# Altium footprint library ref-packages-longpad.PCBLIB: 1527 footprints (part 35 of 103) (continued)
## MQFP80-2 [mm] (continued)
  rectangle: -11.473,-0.6 -9.873,-0.2
  rectangle: -11.473,-1.4 -9.873,-1
  rectangle: -11.473,-2.2 -9.873,-1.8
  rectangle: -11.473,-3 -9.848,-2.6
  rectangle: -11.473,-3.8 -9.898,-3.4
  rectangle: -11.473,-4.6 -9.873,-4.2
  rectangle: -11.473,-5.4 -9.873,-5
  rectangle: 9.873,5.8 11.473,6.2
  rectangle: 9.873,5 11.473,5.4
  rectangle: 9.873,4.2 11.473,4.6
  rectangle: 9.873,3.4 11.473,3.8
  rectangle: 9.873,2.6 11.473,3
  rectangle: 9.873,1.8 11.473,2.2
  rectangle: 9.873,1 11.473,1.4
  rectangle: 9.848,0.2 11.473,0.6
  rectangle: 9.873,-0.6 11.473,-0.2
  rectangle: 9.873,-1.4 11.473,-1
  rectangle: 9.873,-2.2 11.473,-1.8
  rectangle: 9.873,-3 11.473,-2.6
  rectangle: 9.873,-3.8 11.473,-3.4
  rectangle: 9.873,-4.6 11.473,-4.2
  rectangle: 9.873,-5.4 11.473,-5
  rectangle: 9.873,-6.2 11.473,-5.8
  rectangle: -11.473,-6.2 -9.873,-5.8

## MQFP100 [mm]
pads (100):
  rect 0.35x2.2 smd: 1(-9.425,-8.1) 2(-8.775,-8.1) 3(-8.125,-8.1) 4(-7.475,-8.1) 5(-6.825,-8.1) 6(-6.175,-8.1) 7(-5.525,-8.1) 8(-4.875,-8.1) 9(-4.225,-8.1) 10(-3.575,-8.1) 11(-2.925,-8.1) 12(-2.275,-8.1) 13(-1.625,-8.1) 14(-0.975,-8.1) 15(-0.325,-8.1) 16(0.325,-8.1) 17(0.975,-8.1) 18(1.625,-8.1) 19(2.275,-8.1) 20(2.925,-8.1) 21(3.575,-8.1) 22(4.225,-8.1) 23(4.875,-8.1) 24(5.525,-8.1) 25(6.175,-8.1) 26(6.825,-8.1) 27(7.475,-8.1) 28(8.125,-8.1) 29(8.775,-8.1) 30(9.425,-8.1) 51(9.425,8.1) 52(8.775,8.1) 53(8.125,8.1) 54(7.475,8.1) 55(6.825,8.1) 56(6.175,8.1) 57(5.525,8.1) 58(4.875,8.1) 59(4.225,8.1) 60(3.575,8.1) 61(2.925,8.1) 62(2.275,8.1) 63(1.625,8.1) 64(0.975,8.1) 65(0.325,8.1) 66(-0.325,8.1) 67(-0.975,8.1) 68(-1.625,8.1) 69(-2.275,8.1) 70(-2.925,8.1) 71(-3.575,8.1) 72(-4.225,8.1) 73(-4.875,8.1) 74(-5.525,8.1) 75(-6.175,8.1) 76(-6.825,8.1) 77(-7.475,8.1) 78(-8.125,8.1) 79(-8.775,8.1) 80(-9.425,8.1)
  rect 2.2x0.35 smd: 31(11.1,-6.175) 32(11.1,-5.525) 33(11.1,-4.875) 34(11.1,-4.225) 35(11.1,-3.575) 36(11.1,-2.925) 37(11.1,-2.275) 38(11.1,-1.625) 39(11.1,-0.975) 40(11.1,-0.325) 41(11.1,0.325) 42(11.1,0.975) 43(11.1,1.625) 44(11.1,2.275) 45(11.1,2.925) 46(11.1,3.575) 47(11.1,4.225) 48(11.1,4.875) 49(11.1,5.525) 50(11.1,6.175) 81(-11.1,6.175) 82(-11.1,5.525) 83(-11.1,4.875) 84(-11.1,4.225) 85(-11.1,3.575) 86(-11.1,2.925) 87(-11.1,2.275) 88(-11.1,1.625) 89(-11.1,0.975) 90(-11.1,0.325) 91(-11.1,-0.325) 92(-11.1,-0.975) 93(-11.1,-1.625) 94(-11.1,-2.275) 95(-11.1,-2.925) 96(-11.1,-3.575) 97(-11.1,-4.225) 98(-11.1,-4.875) 99(-11.1,-5.525) 100(-11.1,-6.175)
Top Overlay:
  circle w0.152: c-8.9,-6 r0.608
  lines w0.152: -9.873,-6.473 -9.873,6.473 -9.473,6.873 9.473,6.873 9.873,6.473 9.873,-6.473 9.473,-6.873 -9.473,-6.873 -9.873,-6.473
Mechanical 16:
  rectangle: -9.6,-8.473 -9.25,-6.873
  rectangle: -8.95,-8.473 -8.6,-6.873
  rectangle: -8.3,-8.473 -7.95,-6.873
  rectangle: -7.65,-8.473 -7.3,-6.873
  rectangle: -7,-8.473 -6.65,-6.873
  rectangle: -6.35,-8.473 -6,-6.873
  rectangle: -5.7,-8.473 -5.35,-6.873
  rectangle: -5.05,-8.473 -4.7,-6.873
  rectangle: -4.4,-8.473 -4.05,-6.873
  rectangle: -3.75,-8.473 -3.4,-6.873
  rectangle: -3.1,-8.473 -2.75,-6.873
  rectangle: -2.45,-8.473 -2.1,-6.873
  rectangle: -1.8,-8.473 -1.45,-6.873
  rectangle: -1.15,-8.473 -0.8,-6.873
  rectangle: -0.5,-8.473 -0.15,-6.873
  rectangle: 0.15,-8.473 0.5,-6.873
  rectangle: 0.8,-8.473 1.15,-6.873
  rectangle: 1.45,-8.473 1.8,-6.873
  rectangle: 2.1,-8.473 2.45,-6.873
  rectangle: 2.75,-8.473 3.1,-6.873
  rectangle: 3.4,-8.473 3.75,-6.873
  rectangle: 4.05,-8.473 4.4,-6.873
  rectangle: 4.7,-8.473 5.05,-6.873
  rectangle: 5.35,-8.473 5.7,-6.873
  rectangle: 6,-8.473 6.35,-6.873
  rectangle: 6.65,-8.473 7,-6.873
  rectangle: 7.3,-8.473 7.65,-6.873
  rectangle: 7.95,-8.473 8.3,-6.873
  rectangle: 8.6,-8.473 8.95,-6.873
  rectangle: 9.25,-8.473 9.6,-6.873
  rectangle: -9.6,6.873 -9.25,8.473
  rectangle: -8.95,6.873 -8.6,8.473
  rectangle: -8.3,6.873 -7.95,8.473
  rectangle: -7.65,6.873 -7.3,8.473
  rectangle: -7,6.873 -6.65,8.473
  rectangle: -6.35,6.873 -6,8.473
  rectangle: -5.7,6.873 -5.35,8.473
  rectangle: -5.05,6.873 -4.7,8.473
  rectangle: -4.4,6.873 -4.05,8.473
  rectangle: -3.75,6.873 -3.4,8.473
  rectangle: -3.1,6.873 -2.75,8.473
  rectangle: -2.45,6.873 -2.1,8.473
  rectangle: -1.8,6.873 -1.45,8.473
  rectangle: -1.15,6.873 -0.8,8.473
  rectangle: -0.5,6.873 -0.15,8.473
  rectangle: 0.15,6.873 0.5,8.473
  rectangle: 0.8,6.873 1.15,8.473
  rectangle: 1.45,6.873 1.8,8.473
  rectangle: 2.1,6.873 2.45,8.473
  rectangle: 2.75,6.873 3.1,8.473
  rectangle: 3.4,6.873 3.75,8.473
  rectangle: 4.05,6.873 4.4,8.473
  rectangle: 4.7,6.873 5.05,8.473
  rectangle: 5.35,6.873 5.7,8.473
  rectangle: 6,6.873 6.35,8.473
  rectangle: 6.65,6.873 7,8.473
  rectangle: 7.275,6.873 7.65,8.473
  rectangle: 7.95,6.873 8.3,8.473
  rectangle: 8.6,6.873 8.95,8.473
  rectangle: 9.25,6.873 9.6,8.473
  rectangle: 9.873,6 11.473,6.35
  rectangle: 9.873,5.35 11.473,5.7
  rectangle: 9.873,4.7 11.473,5.05
  rectangle: 9.873,4.05 11.473,4.4
  rectangle: 9.873,3.4 11.473,3.75
  rectangle: 9.873,2.75 11.473,3.1
  rectangle: 9.873,2.1 11.473,2.45
  rectangle: 9.873,1.45 11.473,1.8
  rectangle: 9.873,0.8 11.473,1.15
  rectangle: 9.873,0.15 11.473,0.5
  rectangle: 9.873,-0.5 11.473,-0.15
  rectangle: 9.873,-1.15 11.473,-0.8
  rectangle: 9.873,-1.8 11.473,-1.45
  rectangle: 9.873,-2.45 11.473,-2.1
  rectangle: 9.873,-3.1 11.473,-2.75
  rectangle: 9.873,-3.75 11.473,-3.4
  rectangle: 9.873,-4.4 11.473,-4.05
  rectangle: 9.873,-5.05 11.473,-4.7
  rectangle: 9.873,-5.7 11.473,-5.35
  rectangle: 9.873,-6.35 11.473,-6
  rectangle: -11.473,6 -9.873,6.35
  rectangle: -11.473,5.35 -9.873,5.7
  rectangle: -11.473,4.7 -9.873,5.05
  rectangle: -11.473,4.05 -9.873,4.4
  rectangle: -11.473,3.4 -9.873,3.75
  rectangle: -11.473,2.75 -9.873,3.1
  rectangle: -11.473,2.1 -9.873,2.45
  rectangle: -11.473,1.45 -9.873,1.8
  rectangle: -11.473,0.8 -9.873,1.15
  rectangle: -11.473,0.15 -9.873,0.5
  rectangle: -11.473,-0.5 -9.848,-0.15
  rectangle: -11.473,-1.15 -9.873,-0.8
  rectangle: -11.473,-1.8 -9.873,-1.45
  rectangle: -11.473,-2.45 -9.873,-2.1
  rectangle: -11.473,-3.1 -9.873,-2.75
  rectangle: -11.473,-3.75 -9.873,-3.4
  rectangle: -11.473,-4.4 -9.873,-4.05
  rectangle: -11.473,-5.05 -9.873,-4.7
  rectangle: -11.473,-5.7 -9.873,-5.35
  rectangle: -11.473,-6.35 -9.873,-6

## MQFP132 [mm]
pads (132):
  rect 0.35x2.2 smd: 1(0,12.7) 2(-0.635,12.7) 3(-1.27,12.7) 4(-1.905,12.7) 5(-2.54,12.7) 6(-3.175,12.7) 7(-3.81,12.7) 8(-4.445,12.7) 9(-5.08,12.7) 10(-5.715,12.7) 11(-6.35,12.7) 12(-6.985,12.7) 13(-7.62,12.7) 14(-8.255,12.7) 15(-8.89,12.7) 16(-9.525,12.7) 17(-10.16,12.7) 51(-10.16,-13.97) 52(-9.525,-13.97) 53(-8.89,-13.97) 54(-8.255,-13.97) 55(-7.62,-13.97) 56(-6.985,-13.97) 57(-6.35,-13.97) 58(-5.715,-13.97) 59(-5.08,-13.97) 60(-4.445,-13.97) 61(-3.81,-13.97) 62(-3.175,-13.97) 63(-2.54,-13.97) 64(-1.905,-13.97) 65(-1.27,-13.97) 66(-0.635,-13.97) 67(0,-13.97) 68(0.635,-13.97) 69(1.27,-13.97) 70(1.905,-13.97) 71(2.54,-13.97) 72(3.175,-13.97) 73(3.81,-13.97) 74(4.445,-13.97) 75(5.08,-13.97) 76(5.715,-13.97) 77(6.35,-13.97) 78(6.985,-13.97) 79(7.62,-13.97) 80(8.255,-13.97) 81(8.89,-13.97) 82(9.525,-13.97) 83(10.16,-13.97) 117(10.16,12.7) 118(9.525,12.7) 119(8.89,12.7) 120(8.255,12.7) 121(7.62,12.7) 122(6.985,12.7) 123(6.35,12.7) 124(5.715,12.7) 125(5.08,12.7) 126(4.445,12.7) 127(3.81,12.7) 128(3.175,12.7) 129(2.54,12.7) 130(1.905,12.7) 131(1.27,12.7) 132(0.635,12.7)
  rect 2.2x0.35 smd: 18(-13.335,9.525) 19(-13.335,8.89) 20(-13.335,8.255) 21(-13.335,7.62) 22(-13.335,6.985) 23(-13.335,6.35) 24(-13.335,5.715) 25(-13.335,5.08) 26(-13.335,4.445) 27(-13.335,3.81) 28(-13.335,3.175) 29(-13.335,2.54) 30(-13.335,1.905) 31(-13.335,1.27) 32(-13.335,0.635) 33(-13.335,0) 34(-13.335,-0.635) 35(-13.335,-1.27) 36(-13.335,-1.905) 37(-13.335,-2.54) 38(-13.335,-3.175) 39(-13.335,-3.81) 40(-13.335,-4.445) 41(-13.335,-5.08) 42(-13.335,-5.715) 43(-13.335,-6.35) 44(-13.335,-6.985) 45(-13.335,-7.62) 46(-13.335,-8.255) 47(-13.335,-8.89) 48(-13.335,-9.525) 49(-13.335,-10.16) 50(-13.335,-10.795) 84(13.335,-10.795) 85(13.335,-10.16) 86(13.335,-9.525) 87(13.335,-8.89) 88(13.335,-8.255) 89(13.335,-7.62) 90(13.335,-6.985) 91(13.335,-6.35) 92(13.335,-5.715) 93(13.335,-5.08) 94(13.335,-4.445) 95(13.335,-3.81) 96(13.335,-3.175) 97(13.335,-2.54) 98(13.335,-1.905) 99(13.335,-1.27) 100(13.335,-0.635) 101(13.335,0) 102(13.335,0.635) 103(13.335,1.27) 104(13.335,1.905) 105(13.335,2.54) 106(13.335,3.175) 107(13.335,3.81) 108(13.335,4.445) 109(13.335,5.08) 110(13.335,5.715) 111(13.335,6.35) 112(13.335,6.985) 113(13.335,7.62) 114(13.335,8.255) 115(13.335,8.89) 116(13.335,9.525)
Top Overlay:
  lines w0.051: -12.233,-11.868 -11.733,-11.868 ; -12.233,10.583 -11.733,10.583 ; -11.233,-12.868 -11.233,-12.368 ; -11.233,11.583 -11.233,11.083 ; 11.217,11.583 11.217,11.083 ; 11.218,-12.868 11.218,-12.368 ; 12.218,-11.868 11.718,-11.868 ; 12.217,10.583 11.717,10.583 ; -11.733,-11.868 -11.733,10.583 ; -11.733,-11.868 -11.233,-12.368 ; -11.733,10.583 -11.233,11.083 ; -11.233,-12.368 11.218,-12.368 ; -11.233,11.083 11.217,11.083 ; 11.217,11.083 11.717,10.583 ; 11.218,-12.368 11.718,-11.868 ; 11.717,10.583 11.718,-11.868
  lines w0.152: -12.233,-11.868 -11.233,-12.868 ; -12.233,10.583 -11.233,11.583 ; 11.217,11.583 12.217,10.583 ; 11.218,-12.868 12.218,-11.868
  lines w0.508: 0,8.414 0,10.319 ; 0,10.319 0.635,9.684 -0.635,9.684 0,10.319
Mechanical 16:
  rectangle: 1.111,11.589 1.429,12.7
  rectangle: 1.746,11.589 2.064,12.7
  rectangle: 2.381,11.589 2.699,12.7
  rectangle: 3.016,11.589 3.334,12.7
  rectangle: 3.651,11.589 3.969,12.7
  rectangle: 4.286,11.589 4.604,12.7
  rectangle: 0.476,11.589 0.794,12.7
  rectangle: -0.159,11.589 0.159,12.7
  rectangle: -0.794,11.589 -0.476,12.7
  rectangle: -1.429,11.589 -1.111,12.7
  rectangle: -2.064,11.589 -1.746,12.7
  rectangle: -2.699,11.589 -2.381,12.7
  rectangle: -3.334,11.589 -3.016,12.7
  rectangle: -3.969,11.589 -3.651,12.7
  rectangle: -4.604,11.589 -4.286,12.7
  rectangle: -5.239,11.589 -4.921,12.7
  rectangle: -5.874,11.589 -5.556,12.7
  rectangle: -6.509,11.589 -6.191,12.7
  rectangle: -7.144,11.589 -6.826,12.7
  rectangle: -7.779,11.589 -7.461,12.7
  rectangle: -8.414,11.589 -8.096,12.7
  rectangle: -9.049,11.589 -8.731,12.7
  rectangle: -9.684,11.589 -9.366,12.7
  rectangle: -10.319,11.589 -10.001,12.7
  rectangle: 4.921,11.589 5.239,12.7
  rectangle: 5.556,11.589 5.874,12.7
  rectangle: 6.191,11.589 6.509,12.7
  rectangle: 6.826,11.589 7.144,12.7
  rectangle: 7.461,11.589 7.779,12.7
  rectangle: 8.096,11.589 8.414,12.7
  rectangle: 8.731,11.589 9.049,12.7
  rectangle: 9.366,11.589 9.684,12.7
  rectangle: 10.001,11.589 10.319,12.7
  rectangle: 12.224,9.366 13.335,9.684
  rectangle: 12.224,8.731 13.335,9.049
  rectangle: 12.224,8.096 13.335,8.414
  rectangle: 12.224,7.461 13.335,7.779
  rectangle: 12.224,6.826 13.335,7.144
  rectangle: 12.224,6.191 13.335,6.509
  rectangle: 12.224,5.556 13.335,5.874
  rectangle: 12.224,4.921 13.335,5.239
  rectangle: 12.224,4.286 13.335,4.604
  rectangle: 12.224,3.651 13.335,3.969
  rectangle: 12.224,3.016 13.335,3.334
  rectangle: 12.224,2.381 13.335,2.699
  rectangle: 12.224,1.746 13.335,2.064
  rectangle: 12.224,1.111 13.335,1.429
  rectangle: 12.224,0.476 13.335,0.794
  rectangle: 12.224,-0.159 13.335,0.159
  rectangle: 12.224,-0.794 13.335,-0.476
  rectangle: 12.224,-1.429 13.335,-1.111
  rectangle: 12.224,-2.064 13.335,-1.746
  rectangle: 12.224,-2.699 13.335,-2.381
  rectangle: 12.224,-3.334 13.335,-3.016
  rectangle: 12.224,-3.969 13.335,-3.651
  rectangle: 12.224,-4.604 13.335,-4.286
  rectangle: 12.224,-5.239 13.335,-4.921
  rectangle: 12.224,-5.874 13.335,-5.556
  rectangle: 12.224,-6.509 13.335,-6.191
  rectangle: 12.224,-7.144 13.335,-6.826
  rectangle: 12.224,-7.779 13.335,-7.461
  rectangle: 12.224,-8.414 13.335,-8.096
  rectangle: 12.224,-9.049 13.335,-8.731
  rectangle: 12.224,-9.684 13.335,-9.366
  rectangle: 12.224,-10.319 13.335,-10.001
  rectangle: 12.224,-10.954 13.335,-10.636
  rectangle: 10.001,-13.97 10.319,-12.859
  rectangle: 9.366,-13.97 9.684,-12.859
  rectangle: 8.731,-13.97 9.049,-12.859
  rectangle: 8.096,-13.97 8.414,-12.859
  rectangle: 7.461,-13.97 7.779,-12.859
  rectangle: 6.826,-13.97 7.144,-12.859
  rectangle: 6.191,-13.97 6.509,-12.859
  rectangle: 5.556,-13.97 5.874,-12.859
  rectangle: 4.921,-13.97 5.239,-12.859
  rectangle: 4.286,-13.97 4.604,-12.859
  rectangle: 3.651,-13.97 3.969,-12.859
  rectangle: 3.016,-13.97 3.334,-12.859
  rectangle: 2.381,-13.97 2.699,-12.859
  rectangle: 1.746,-13.97 2.064,-12.859
  rectangle: 1.111,-13.97 1.429,-12.859
  rectangle: 0.476,-13.97 0.794,-12.859
  rectangle: -0.159,-13.97 0.159,-12.859
  rectangle: -0.794,-13.97 -0.476,-12.859
  rectangle: -1.429,-13.97 -1.111,-12.859
  rectangle: -2.064,-13.97 -1.746,-12.859
  rectangle: -2.699,-13.97 -2.381,-12.859
  rectangle: -3.334,-13.97 -3.016,-12.859
  rectangle: -3.969,-13.97 -3.651,-12.859
  rectangle: -4.604,-13.97 -4.286,-12.859
  rectangle: -5.239,-13.97 -4.921,-12.859
  rectangle: -5.874,-13.97 -5.556,-12.859
  rectangle: -6.509,-13.97 -6.191,-12.859
  rectangle: -7.144,-13.97 -6.826,-12.859
  rectangle: -7.779,-13.97 -7.461,-12.859
  rectangle: -8.414,-13.97 -8.096,-12.859
  rectangle: -9.049,-13.97 -8.731,-12.859
  rectangle: -9.684,-13.97 -9.366,-12.859
  rectangle: -10.319,-13.97 -10.001,-12.859
  rectangle: -13.335,-10.954 -12.224,-10.636
  rectangle: -13.335,-10.319 -12.224,-10.001
  rectangle: -13.335,-9.684 -12.224,-9.366
  rectangle: -13.335,-9.049 -12.224,-8.731
  rectangle: -13.335,-8.414 -12.224,-8.096
  rectangle: -13.335,-7.779 -12.224,-7.461
  rectangle: -13.335,-7.144 -12.224,-6.826
  rectangle: -13.335,-6.509 -12.224,-6.191
  rectangle: -13.335,-5.874 -12.224,-5.556
  rectangle: -13.335,-5.239 -12.224,-4.921
  rectangle: -13.335,-4.604 -12.224,-4.286
  rectangle: -13.335,-3.969 -12.224,-3.651
  rectangle: -13.335,-3.334 -12.224,-3.016
  rectangle: -13.335,-2.699 -12.224,-2.381
  rectangle: -13.335,-2.064 -12.224,-1.746
  rectangle: -13.335,-1.429 -12.224,-1.111
  rectangle: -13.335,-0.794 -12.224,-0.476
  rectangle: -13.335,-0.159 -12.224,0.159
  rectangle: -13.335,0.476 -12.224,0.794
  rectangle: -13.335,1.111 -12.224,1.429
  rectangle: -13.335,1.746 -12.224,2.064
  rectangle: -13.335,2.381 -12.224,2.699
  rectangle: -13.335,3.016 -12.224,3.334
  rectangle: -13.335,3.651 -12.224,3.969
  rectangle: -13.335,4.286 -12.224,4.604
  rectangle: -13.335,4.921 -12.224,5.239
  rectangle: -13.335,5.556 -12.224,5.874
  rectangle: -13.335,6.191 -12.224,6.509
  rectangle: -13.335,6.826 -12.224,7.144
  rectangle: -13.335,7.461 -12.224,7.779
  rectangle: -13.335,8.096 -12.224,8.414
  rectangle: -13.335,9.366 -12.224,9.684
  lines w0.152: -12.233,-11.868 -12.233,10.583 ; -11.233,-12.868 11.218,-12.868 ; -11.233,11.583 11.217,11.583 ; 12.218,-11.868 12.217,10.583

## MQFP144 [mm]
pads (144):
  rect 0.35x2.2 smd: 1(-11.375,-15.1) 2(-10.725,-15.1) 3(-10.075,-15.1) 4(-9.425,-15.1) 5(-8.775,-15.1) 6(-8.125,-15.1) 7(-7.475,-15.1) 8(-6.825,-15.1) 9(-6.175,-15.1) 10(-5.525,-15.1) 11(-4.875,-15.1) 12(-4.225,-15.1) 13(-3.575,-15.1) 14(-2.925,-15.1) 15(-2.275,-15.1) 16(-1.625,-15.1) 17(-0.975,-15.1) 18(-0.325,-15.1) 19(0.325,-15.1) 20(0.975,-15.1) 21(1.625,-15.1) 22(2.275,-15.1) 23(2.925,-15.1) 24(3.575,-15.1) 25(4.225,-15.1) 26(4.875,-15.1) 27(5.525,-15.1) 28(6.175,-15.1) 29(6.825,-15.1) 30(7.475,-15.1) 31(8.125,-15.1) 32(8.775,-15.1) 33(9.425,-15.1) 34(10.075,-15.1) 35(10.725,-15.1) 36(11.375,-15.1) 73(11.375,15.1) 74(10.725,15.1) 75(10.075,15.1) 76(9.425,15.1) 77(8.775,15.1) 78(8.125,15.1) 79(7.475,15.1) 80(6.825,15.1) 81(6.175,15.1) 82(5.525,15.1) 83(4.875,15.1) 84(4.225,15.1) 85(3.575,15.1) 86(2.925,15.1) 87(2.275,15.1) 88(1.625,15.1) 89(0.975,15.1) 90(0.325,15.1) 91(-0.325,15.1) 92(-0.975,15.1) 93(-1.625,15.1) 94(-2.275,15.1) 95(-2.925,15.1) 96(-3.575,15.1) 97(-4.225,15.1) 98(-4.875,15.1) 99(-5.525,15.1) 100(-6.175,15.1) 101(-6.825,15.1) 102(-7.475,15.1) 103(-8.125,15.1) 104(-8.775,15.1) 105(-9.425,15.1) 106(-10.075,15.1) 107(-10.725,15.1) 108(-11.375,15.1)
  rect 2.2x0.35 smd: 37(15.1,-11.375) 38(15.1,-10.725) 39(15.1,-10.075) 40(15.1,-9.425) 41(15.1,-8.775) 42(15.1,-8.125) 43(15.1,-7.475) 44(15.1,-6.825) 45(15.1,-6.175) 46(15.1,-5.525) 47(15.1,-4.875) 48(15.1,-4.225) 49(15.1,-3.575) 50(15.1,-2.925) 51(15.1,-2.275) 52(15.1,-1.625) 53(15.1,-0.975) 54(15.1,-0.325) 55(15.1,0.325) 56(15.1,0.975) 57(15.1,1.625) 58(15.1,2.275) 59(15.1,2.925) 60(15.1,3.575) 61(15.1,4.225) 62(15.1,4.875) 63(15.1,5.525) 64(15.1,6.175) 65(15.1,6.825) 66(15.1,7.475) 67(15.1,8.125) 68(15.1,8.775) 69(15.1,9.425) 70(15.1,10.075) 71(15.1,10.725) 72(15.1,11.375) 109(-15.1,11.375) 110(-15.1,10.725) 111(-15.1,10.075) 112(-15.1,9.425) 113(-15.1,8.775) 114(-15.1,8.125) 115(-15.1,7.475) 116(-15.1,6.825) 117(-15.1,6.175) 118(-15.1,5.525) 119(-15.1,4.875) 120(-15.1,4.225) 121(-15.1,3.575) 122(-15.1,2.925) 123(-15.1,2.275) 124(-15.1,1.625) 125(-15.1,0.975) 126(-15.1,0.325) 127(-15.1,-0.325) 128(-15.1,-0.975) 129(-15.1,-1.625) 130(-15.1,-2.275) 131(-15.1,-2.925) 132(-15.1,-3.575) 133(-15.1,-4.225) 134(-15.1,-4.875) 135(-15.1,-5.525) 136(-15.1,-6.175) 137(-15.1,-6.825) 138(-15.1,-7.475) 139(-15.1,-8.125) 140(-15.1,-8.775) 141(-15.1,-9.425) 142(-15.1,-10.075) 143(-15.1,-10.725) 144(-15.1,-11.375)
Top Overlay:
  circle w0.152: c-11,-11 r1
  lines w0.152: -13.873,-13.373 -13.373,-13.873 13.373,-13.873 13.873,-13.373 13.873,13.373 13.373,13.873 -13.373,13.873 -13.873,13.373 -13.873,-13.373 ; -13.373,-12.873 -12.873,-13.373 12.873,-13.373 13.373,-12.873 13.373,12.873 12.873,13.373 -12.873,13.373 -13.373,12.873 -13.373,-12.873
Mechanical 16:
  rectangle: -11.55,13.746 -11.2,15.346
  rectangle: -10.9,13.746 -10.55,15.346
  rectangle: -10.25,13.746 -9.9,15.346
  rectangle: -9.6,13.746 -9.25,15.346
  rectangle: -8.95,13.746 -8.6,15.346
  rectangle: -8.3,13.746 -7.95,15.346
  rectangle: -7.65,13.746 -7.3,15.346
  rectangle: -7,13.746 -6.65,15.346
  rectangle: -6.35,13.746 -6,15.346
  rectangle: -5.7,13.746 -5.35,15.346
  rectangle: -5.05,13.746 -4.7,15.346
  rectangle: -4.4,13.746 -4.05,15.346
  rectangle: -3.75,13.746 -3.4,15.346
  rectangle: -3.1,13.746 -2.75,15.346
  rectangle: -2.45,13.746 -2.1,15.346
  rectangle: -1.8,13.746 -1.45,15.346
  rectangle: -1.15,13.746 -0.8,15.346
  rectangle: -0.5,13.746 -0.15,15.346
  rectangle: 0.15,13.746 0.5,15.346
  rectangle: 0.8,13.746 1.15,15.346
  rectangle: 1.45,13.746 1.8,15.346
  rectangle: 2.1,13.746 2.45,15.346
  rectangle: 2.75,13.746 3.1,15.346
  rectangle: 3.4,13.746 3.75,15.346
  rectangle: 4.05,13.746 4.4,15.346
  rectangle: 4.7,13.746 5.05,15.346
  rectangle: 5.35,13.746 5.7,15.346
  rectangle: 6,13.746 6.35,15.346
  rectangle: 6.65,13.746 7,15.346
  rectangle: 7.3,13.746 7.65,15.346
  rectangle: 7.95,13.746 8.3,15.346
  rectangle: 8.6,13.746 8.95,15.346
  rectangle: 9.25,13.746 9.6,15.346
  rectangle: 9.9,13.746 10.25,15.346
  rectangle: 10.55,13.746 10.9,15.346
  rectangle: 11.2,13.746 11.55,15.346
  rectangle: 13.746,11.2 15.346,11.55
  rectangle: 13.746,10.55 15.346,10.9
  rectangle: 13.746,9.9 15.346,10.25
  rectangle: 13.746,9.25 15.346,9.6
  rectangle: 13.746,8.6 15.346,8.95
  rectangle: 13.746,7.95 15.346,8.3
  rectangle: 13.746,7.3 15.346,7.65
  rectangle: 13.721,6 15.346,6.35
  rectangle: 13.746,5.35 15.346,5.7
  rectangle: 13.746,4.7 15.346,5.05
  rectangle: 13.746,4.05 15.346,4.4
  rectangle: 13.746,6.65 15.346,7
  rectangle: 13.746,3.4 15.346,3.75
  rectangle: 13.746,2.75 15.346,3.1
  rectangle: 13.746,2.1 15.346,2.45
  rectangle: 13.746,1.45 15.346,1.8
  rectangle: 13.746,0.8 15.346,1.15
  rectangle: 13.746,0.15 15.346,0.5
  rectangle: 13.721,-0.5 15.346,-0.15
  rectangle: 13.746,-1.15 15.346,-0.8
  rectangle: 13.746,-1.8 15.346,-1.45
  rectangle: 13.771,-2.45 15.346,-2.1
  rectangle: 13.746,-3.1 15.346,-2.75
  rectangle: 13.746,-3.75 15.346,-3.4
  rectangle: 13.746,-4.4 15.346,-4.05
  rectangle: 13.746,-5.05 15.346,-4.7
  rectangle: 13.746,-5.7 15.346,-5.35
  rectangle: 13.746,-6.35 15.346,-6
  rectangle: 13.746,-7 15.346,-6.65
  rectangle: 13.746,-7.65 15.346,-7.3
  rectangle: 13.721,-7.95 13.746,-7.925
  rectangle: 13.746,-8.3 15.346,-7.95
  rectangle: 13.746,-8.95 15.346,-8.6
  rectangle: 13.746,-9.6 15.346,-9.25
  rectangle: 13.746,-10.25 15.346,-9.9
  rectangle: 13.721,-10.9 15.346,-10.55
  rectangle: 13.746,-11.55 15.346,-11.2
  rectangle: -15.346,11.2 -13.746,11.55
  rectangle: -15.346,10.55 -13.746,10.9
  rectangle: -15.346,9.9 -13.746,10.25
  rectangle: -15.346,9.25 -13.746,9.6
  rectangle: -15.346,8.6 -13.746,8.95
  rectangle: -15.346,7.95 -13.746,8.3
  rectangle: -15.346,7.3 -13.746,7.65
  rectangle: -15.346,6.65 -13.746,7
  rectangle: -15.346,6 -13.746,6.35
  rectangle: -15.346,5.35 -13.746,5.7
  rectangle: -15.346,4.7 -13.746,5.05
  rectangle: -15.346,4.05 -13.771,4.4
  rectangle: -15.346,3.4 -13.746,3.75
  rectangle: -15.346,2.75 -13.746,3.1
  rectangle: -15.346,2.1 -13.746,2.45
  rectangle: -15.346,1.45 -13.746,1.8
  rectangle: -15.346,0.8 -13.746,1.15
  rectangle: -15.346,0.15 -13.746,0.5
  rectangle: -15.346,-0.5 -13.746,-0.15
  rectangle: -15.346,-1.15 -13.746,-0.8
  rectangle: -15.346,-1.8 -13.746,-1.45
  rectangle: -15.346,-2.45 -13.746,-2.1
  rectangle: -15.346,-3.1 -13.721,-2.75
  rectangle: -15.346,-3.75 -13.746,-3.4
  rectangle: -15.346,-4.4 -13.746,-4.05
  rectangle: -15.346,-5.05 -13.746,-4.7
  rectangle: -15.346,-5.7 -13.746,-5.35
  rectangle: -15.346,-6.35 -13.746,-6
  rectangle: -15.346,-7 -13.746,-6.65
  rectangle: -15.346,-7.65 -13.746,-7.3
  rectangle: -15.346,-8.3 -13.746,-7.95
  rectangle: -15.346,-8.95 -13.721,-8.6
  rectangle: -15.346,-9.6 -13.746,-9.25
  rectangle: -15.346,-10.25 -13.746,-9.9
  rectangle: -15.346,-10.9 -13.746,-10.55
  rectangle: -15.346,-11.55 -13.721,-11.2
  rectangle: -11.55,-15.346 -11.2,-13.746
  rectangle: -10.9,-15.346 -10.55,-13.746
  rectangle: -10.25,-15.346 -9.9,-13.746
  rectangle: -9.6,-15.346 -9.25,-13.746
  rectangle: -8.95,-15.346 -8.6,-13.746
  rectangle: -8.3,-15.346 -7.95,-13.746
  rectangle: -7.65,-15.346 -7.3,-13.746
  rectangle: -7,-15.346 -6.65,-13.746
  rectangle: -6.35,-15.346 -6,-13.746
  rectangle: -5.7,-15.346 -5.35,-13.746
  rectangle: -5.05,-15.346 -4.7,-13.746
  rectangle: -4.4,-15.346 -4.05,-13.746
  rectangle: -3.75,-15.346 -3.4,-13.746
  rectangle: -3.1,-15.346 -2.75,-13.746
  rectangle: -2.45,-15.346 -2.1,-13.746
  rectangle: -1.8,-15.346 -1.45,-13.746
  rectangle: -1.15,-15.346 -0.8,-13.746
  rectangle: -0.5,-15.346 -0.15,-13.721
  rectangle: 0.15,-15.346 0.5,-13.746
  rectangle: 0.8,-13.796 0.825,-13.771
  rectangle: 0.8,-15.346 1.15,-13.746
  rectangle: 1.45,-15.346 1.8,-13.746
  rectangle: 2.1,-15.346 2.45,-13.746
  rectangle: 2.75,-15.346 3.1,-13.746
  rectangle: 3.4,-15.346 3.75,-13.746
  rectangle: 4.05,-15.346 4.4,-13.746
  rectangle: 4.7,-15.346 5.05,-13.746
  rectangle: 5.375,-15.346 5.7,-13.746
  rectangle: 6,-15.346 6.35,-13.746
  rectangle: 6.65,-15.346 7,-13.746
  rectangle: 7.3,-15.346 7.65,-13.746
  rectangle: 7.95,-15.346 8.3,-13.746
  rectangle: 8.6,-15.346 8.95,-13.746
  rectangle: 9.25,-15.346 9.6,-13.746
  rectangle: 9.9,-15.346 10.25,-13.746
  rectangle: 10.55,-15.346 10.9,-13.746
  rectangle: 11.2,-15.346 11.55,-13.746

## MQFP160 [mm]
pads (160):
  rect 0.35x2.2 smd: 1(-12.675,-15.1) 2(-12.025,-15.1) 3(-11.375,-15.1) 4(-10.725,-15.1) 5(-10.075,-15.1) 6(-9.425,-15.1) 7(-8.775,-15.1) 8(-8.125,-15.1) 9(-7.475,-15.1) 10(-6.825,-15.1) 11(-6.175,-15.1) 12(-5.525,-15.1) 13(-4.875,-15.1) 14(-4.225,-15.1) 15(-3.575,-15.1) 16(-2.925,-15.1) 17(-2.275,-15.1) 18(-1.625,-15.1) 19(-0.975,-15.1) 20(-0.325,-15.1) 21(0.325,-15.1) 22(0.975,-15.1) 23(1.625,-15.1) 24(2.275,-15.1) 25(2.925,-15.1) 26(3.575,-15.1) 27(4.225,-15.1) 28(4.875,-15.1) 29(5.525,-15.1) 30(6.175,-15.1) 31(6.825,-15.1) 32(7.475,-15.1) 33(8.125,-15.1) 34(8.775,-15.1) 35(9.425,-15.1) 36(10.075,-15.1) 37(10.725,-15.1) 38(11.375,-15.1) 39(12.025,-15.1) 40(12.675,-15.1) 81(12.675,15.1) 82(12.025,15.1) 83(11.375,15.1) 84(10.725,15.1) 85(10.075,15.1) 86(9.425,15.1) 87(8.775,15.1) 88(8.125,15.1) 89(7.475,15.1) 90(6.825,15.1) 91(6.175,15.1) 92(5.525,15.1) 93(4.875,15.1) 94(4.225,15.1) 95(3.575,15.1) 96(2.925,15.1) 97(2.275,15.1) 98(1.625,15.1) 99(0.975,15.1) 100(0.325,15.1) 101(-0.325,15.1) 102(-0.975,15.1) 103(-1.625,15.1) 104(-2.275,15.1) 105(-2.925,15.1) 106(-3.575,15.1) 107(-4.225,15.1) 108(-4.875,15.1) 109(-5.525,15.1) 110(-6.175,15.1) 111(-6.825,15.1) 112(-7.475,15.1) 113(-8.125,15.1) 114(-8.775,15.1) 115(-9.425,15.1) 116(-10.075,15.1) 117(-10.725,15.1) 118(-11.375,15.1) 119(-12.025,15.1) 120(-12.675,15.1)
  rect 2.2x0.35 smd: 41(15.1,-12.675) 42(15.1,-12.025) 43(15.1,-11.375) 44(15.1,-10.725) 45(15.1,-10.075) 46(15.1,-9.425) 47(15.1,-8.775) 48(15.1,-8.125) 49(15.1,-7.475) 50(15.1,-6.825) 51(15.1,-6.175) 52(15.1,-5.525) 53(15.1,-4.875) 54(15.1,-4.225) 55(15.1,-3.575) 56(15.1,-2.925) 57(15.1,-2.275) 58(15.1,-1.625) 59(15.1,-0.975) 60(15.1,-0.325) 61(15.1,0.325) 62(15.1,0.975) 63(15.1,1.625) 64(15.1,2.275) 65(15.1,2.925) 66(15.1,3.575) 67(15.1,4.225) 68(15.1,4.875) 69(15.1,5.525) 70(15.1,6.175) 71(15.1,6.825) 72(15.1,7.475) 73(15.1,8.125) 74(15.1,8.775) 75(15.1,9.425) 76(15.1,10.075) 77(15.1,10.725) 78(15.1,11.375) 79(15.1,12.025) 80(15.1,12.675) 121(-15.1,12.675) 122(-15.1,12.025) 123(-15.1,11.375) 124(-15.1,10.725) 125(-15.1,10.075) 126(-15.1,9.425) 127(-15.1,8.775) 128(-15.1,8.125) 129(-15.1,7.475) 130(-15.1,6.825) 131(-15.1,6.175) 132(-15.1,5.525) 133(-15.1,4.875) 134(-15.1,4.225) 135(-15.1,3.575) 136(-15.1,2.925) 137(-15.1,2.275) 138(-15.1,1.625) 139(-15.1,0.975) 140(-15.1,0.325) 141(-15.1,-0.325) 142(-15.1,-0.975) 143(-15.1,-1.625) 144(-15.1,-2.275) 145(-15.1,-2.925) 146(-15.1,-3.575) 147(-15.1,-4.225) 148(-15.1,-4.875) 149(-15.1,-5.525) 150(-15.1,-6.175) 151(-15.1,-6.825) 152(-15.1,-7.475) 153(-15.1,-8.125) 154(-15.1,-8.775) 155(-15.1,-9.425) 156(-15.1,-10.075) 157(-15.1,-10.725) 158(-15.1,-11.375) 159(-15.1,-12.025) 160(-15.1,-12.675)
Top Overlay:
  circle w0.152: c-11.5,-11.5 r1
  lines w0.152: -13.873,-13.123 -13.873,13.873 13.873,13.873 13.873,-13.873 -13.123,-13.873 -13.873,-13.123 ; -13.373,-12.873 -12.873,-13.373 13.373,-13.373 13.373,13.373 -13.373,13.373 -13.373,-12.873
Mechanical 16:
  drawing of 162 lines, arcs and shapes, not listed